# Altium footprint library motor2.PcbLib: 13 footprints
Each footprint in its own frame and in the unit in brackets; x right, y up, seen from the top. Pads: shape width x height; smd on the part's side, far side on the other; paste and mask are expansions set on the pad; w line width, h text height; cw(c..) or ccw(c..) is an arc to the next point about the centre after c.
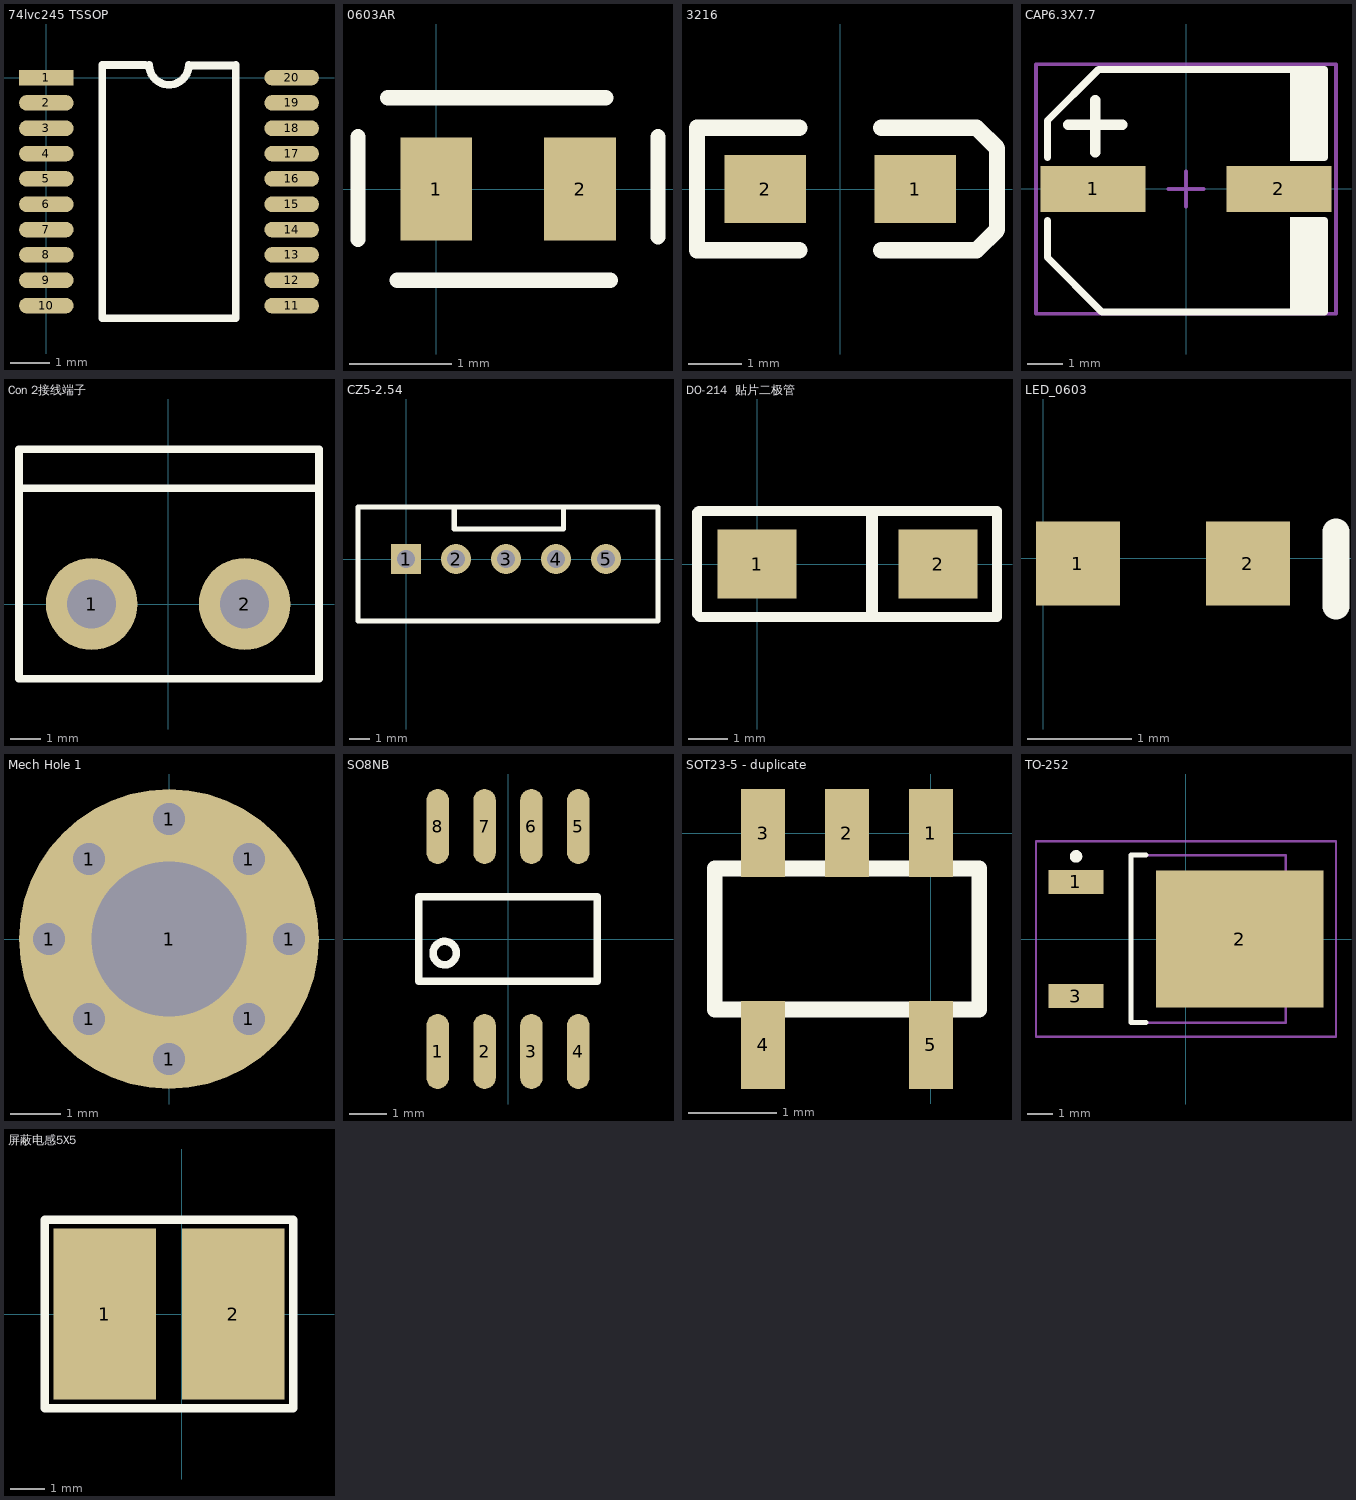
[diagram p0: the footprints below, top view; thin cyan lines are the x and y axes]

## 74lvc245 TSSOP [mm]
pads (20):
  rect 1.4x0.4 smd: 1(0,0)
  oval 1.4x0.4 smd: 2(0,-0.65) 3(0,-1.3) 4(0,-1.95) 5(0,-2.6) 6(0,-3.25) 7(0,-3.9) 8(0,-4.55) 9(0,-5.2) 10(0,-5.85) 11(6.3,-5.85) 12(6.3,-5.2) 13(6.3,-4.55) 14(6.3,-3.9) 15(6.3,-3.25) 16(6.3,-2.6) 17(6.3,-1.95) 18(6.3,-1.3) 19(6.3,-0.65) 20(6.3,0)
Top Overlay:
  lines w0.2: 2.54,0.325 1.435,0.325 1.435,-6.175 4.865,-6.175 4.865,0.325 ; 2.642,0.325 ccw(c3.15,0.325) 3.658,0.325 ; 3.683,0.31 4.788,0.31

## 0603AR [mm]
pads (2):
  rect 0.7x1 smd: 1(0,0) 2(1.4,0)
Top Overlay:
  lines w0.15: -0.762,-0.492 -0.762,0.508 ; -0.474,0.889 1.651,0.889 ; -0.381,-0.889 1.694,-0.889 ; 2.159,-0.467 2.159,0.508
3D body: height 0.3, standoff 0, extent -0.1,-0.4 1.5,0.4

## 3216 [mil]
pads (2):
  rect 60x50 smd: 1(55,0) 2(-55,0)
Top Overlay:
  lines w12: -30,-45 -105,-45 -105,45 -30,45 ; 30,-45 100,-45 115,-30 115,30 100,45 30,45
3D body: height 62.99, standoff 0, extent -62.98,-31.5 63,31.5

## CAP6.3X7.7 [mm] "Precision Wire Wound Inductor, 2-Leads, Body 7.8x6.7mm, IPC High Density"
height 7.3
pads (2):
  rect 3x1.3 smd: 1(-2.65,0) 2(2.65,0)
Top Overlay:
  rectangle: 2.967,-3.5 3.95,-0.801
  rectangle: 2.967,0.8 3.95,3.4
  lines w0.2: -3.95,-0.9 -3.95,-1.95 -2.4,-3.5 3.95,-3.5 3.95,-0.9 ; -3.95,0.9 -3.95,1.95 -2.5,3.4 3.95,3.4 3.95,0.9
  lines w0.3: -3.351,1.83 -1.814,1.83 ; -2.583,1.043 -2.583,2.525
Mechanical 15:
  lines w0.1: -0.5,0 0.5,0 ; 0,-0.5 0,0.5 ; -4.275,-3.55 4.275,-3.55 4.275,3.55 -4.275,3.55 -4.275,-3.55
3D body: height 6.1, standoff 0, extent -2.95,-2.76 2.35,2.54

## Con 2接线端子 [mm]
pads (2):
  round 3 hole 1.6: 1(-2.5,0) 2(2.5,0)
Top Overlay:
  lines w0.254: -4.877,3.785 4.902,3.785 4.928,3.81 ; -4.877,-2.438 4.928,-2.438 4.928,5.055 -4.877,5.055 -4.877,-2.438

## CZ5-2.54 [mm]
pads (5):
  rect 1.5x1.5 hole 0.9: 1(0,0)
  round 1.5 hole 0.9: 2(2.5,0) 3(5,0) 4(7.5,0) 5(10,0)
Top Overlay:
  lines w0.254: 2.413,2.6 2.413,1.5 7.874,1.5 7.874,2.6 ; -2.4,-3.1 12.6,-3.1 12.6,2.6 -2.4,2.6 -2.4,-3.1
3D body: height 7, standoff -3.4, extent -2.511,-3.388 12.519,2.362

## DO-214  贴片二极管 [mm]
height 2.7
pads (2):
  rect 2x1.75 smd: 1(0,0) 2(4.6,0)
Top Overlay:
  lines w0.254: -1.524,-1.27 -1.444,-1.35 -0.4,-1.35 6.096,-1.35 6.096,1.35 -0.4,1.35 -1.477,1.35 -1.524,1.303 -1.524,-1.27
  lines w0.3: 2.92,-1.3 2.92,1.3
3D body: height 2.12, standoff -0.02, extent -0.198,-1.342 4.908,1.325

## LED_0603 [mm]
pads (2):
  rect 0.8x0.8 smd: 1(0.333,-0.051) 2(1.953,-0.051)
Top Overlay:
  lines w0.254: 2.794,-0.457 2.794,0.254
3D body: height 0.6, standoff 0, extent 0.333,-0.451 1.953,0.349

## Mech Hole 1 [mm] "3.1mm"
height 2.38
pads (9):
  round 0.635 hole 0.635: 1(-2.4,0) 1(-1.6,-1.6) 1(-1.6,1.6) 1(0,-2.4) 1(0,2.4) 1(1.6,-1.6) 1(1.6,1.6) 1(2.4,0)
  round 6 hole 3.1: 1(0,0)

## SO8NB [mil]
pads (8):
  oval 24x80 smd: 1(-75,-120) 2(-25,-120) 3(25,-120) 4(75,-120) 5(75,120) 6(25,120) 7(-25,120) 8(-75,120)
Top Overlay:
  circle w8: c-67.5,-15 r12.5
  lines w8: -95,-45 -95,45 95,45 95,-45 -95,-45
3D body: height 61.02, standoff -1.97, extent -96.91,-117.91 96,117.91

## SOT23-5 - duplicate [mm]
pads (5):
  rect 0.5x1 smd: 1(0,0) 2(-0.95,0) 3(-1.9,0) 4(-1.9,-2.4) 5(0,-2.4)
Top Overlay:
  lines w0.178: -2.45,-2 -2.45,-0.4 0.55,-0.4 0.55,-2 -2.45,-2
3D body: height 1.09, standoff -0.01, extent -2.399,-2.599 0.5,0.201

## TO-252 [mm] "D-PAK, 4-Leads, Body 6.1x6.5mm, Pitch 2.28mm, Lead Span 9.8mm, IPC Low Density"
height 2.38
pads (3):
  rect 2.2x0.95 smd: 1(-4.4,2.28) 3(-4.4,-2.28)
  rect 6.7x5.5 smd: 2(2.15,0)
Top Overlay:
  circle w0.25: c-4.4,3.305 r0.125
  lines w0.2: -1.6,-3.35 -2.2,-3.35 -2.2,3.35 -1.6,3.35
Mechanical 13:
  lines w0.1: -2.2,-3.35 -2.2,3.35 4,3.35 4,-3.35 -2.2,-3.35
Mechanical 15:
  lines w0.1: -0.5,0 0.5,0 ; 0,-0.5 0,0.5 ; -6,-3.9 -6,3.9 6,3.9 6,-3.9 -6,-3.9
3D body: height 2.39, standoff -0.02, extent -4.9,-3.27 5.038,3.27

## 屏蔽电感5X5 [mm]
pads (2):
  rect 3x5 smd: 1(-2.25,0) 2(1.5,0)
Top Overlay:
  lines w0.254: -4,-2.75 3.25,-2.75 3.25,2.75 -4,2.75 -4,-2.75
3D body: height 5, standoff -0.05, extent -4.226,-3.393 3.566,3.607